# Altium footprint library BARKO_PCBLIB.PcbLib: 531 footprints (part 10 of 34)
Each footprint in its own frame and in the unit in brackets; x right, y up, seen from the top. Pads: shape width x height; smd on the part's side, far side on the other; paste and mask are expansions set on the pad; w line width, h text height; cw(c..) or ccw(c..) is an arc to the next point about the centre after c.
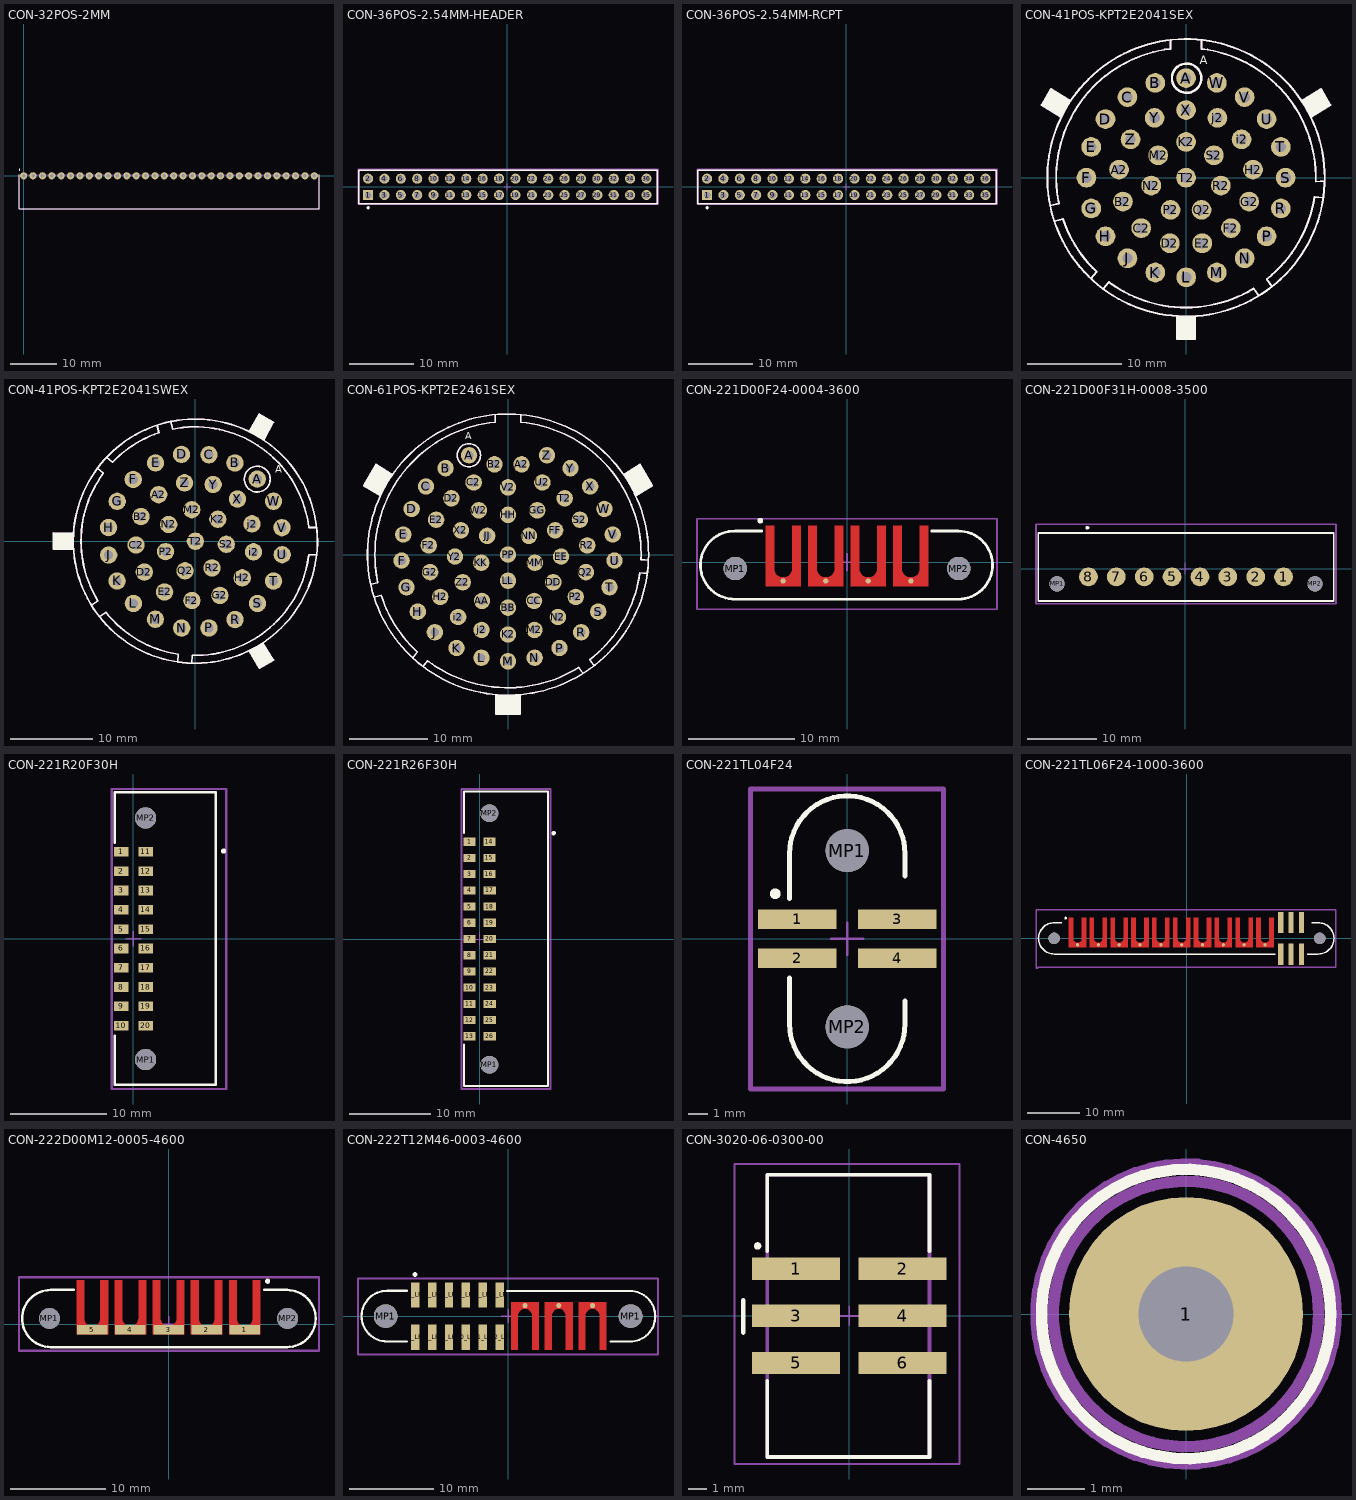
[diagram p9: the footprints below, top view; thin cyan lines are the x and y axes]

## CON-32POS-2MM [mil]
pads (32):
  round 60 hole 30: 1(0,0) 2(78.74,0) 3(157.48,0) 4(236.22,0) 5(314.96,0) 6(393.7,0) 7(472.44,0) 8(551.18,0) 9(629.92,0) 10(708.66,0) 11(787.4,0) 12(866.14,0) 13(944.88,0) 14(1023.62,0) 15(1102.36,0) 16(1181.1,0) 17(1259.84,0) 18(1338.58,0) 19(1417.32,0) 20(1496.06,0) 21(1574.8,0) 22(1653.54,0) 23(1732.28,0) 24(1811.02,0) 25(1889.76,0) 26(1968.5,0) 27(2047.24,0) 28(2125.98,0) 29(2204.72,0) 30(2283.46,0) 31(2362.2,0) 32(2440.94,0)
Top Overlay:
  circle w7.87: c-35.43,51.18 r3.94
  lines w10: -39.37,8.86 -39.37,-276.58 2480.32,-276.58 2480.32,8.86
ASM Top:
  lines w10: -39.37,-276.58 -39.37,8.86 2480.32,8.86 2480.32,-276.58 -39.37,-276.58
  text ".designator" at 1080.41,-156.5 h31.5
3D body "header_32pin_rightangle_2mm.stp": height 78.74, standoff -110.24, extent -39.37,-276.58 2480.32,8.86

## CON-36POS-2.54MM-HEADER [mm]
pads (36):
  rect 1.57x1.57 hole 1.02 paste-1000 mask+0: 1(-21.59,-1.27)
  round 1.57 hole 1.02 paste-1000 mask+0: 2(-21.59,1.27) 3(-19.05,-1.27) 4(-19.05,1.27) 5(-16.51,-1.27) 6(-16.51,1.27) 7(-13.97,-1.27) 8(-13.97,1.27) 9(-11.43,-1.27) 10(-11.43,1.27) 11(-8.89,-1.27) 12(-8.89,1.27) 13(-6.35,-1.27) 14(-6.35,1.27) 15(-3.81,-1.27) 16(-3.81,1.27) 17(-1.27,-1.27) 18(-1.27,1.27) 19(1.27,-1.27) 20(1.27,1.27) 21(3.81,-1.27) 22(3.81,1.27) 23(6.35,-1.27) 24(6.35,1.27) 25(8.89,-1.27) 26(8.89,1.27) 27(11.43,-1.27) 28(11.43,1.27) 29(13.97,-1.27) 30(13.97,1.27) 31(16.51,-1.27) 32(16.51,1.27) 33(19.05,-1.27) 34(19.05,1.27) 35(21.59,-1.27) 36(21.59,1.27)
Top Overlay:
  circle w0.25: c-21.575,-3.245 r0.125
  lines w0.2: -23.05,-2.605 23.27,-2.605 23.27,2.605 -23.05,2.605 -23.05,-2.605
Mechanical 15:
  lines w0.1: -0.5,0 0.5,0 ; 0,-0.5 0,0.5
  lines w0.2: -23.15,-2.705 23.37,-2.705 23.37,2.705 -23.15,2.705 -23.15,-2.705
ASM Top:
  lines w0.2: -23.05,-2.605 23.27,-2.605 23.27,2.605 -23.05,2.605 -23.05,-2.605
  text ".Designator" at -2.13,-0.3 h1
3D body "TSW-118-17-G-D.stp": height 18.3, standoff -2.78, extent -22.86,-2.54 22.86,2.54

## CON-36POS-2.54MM-RCPT [mm]
pads (36):
  rect 1.57x1.57 hole 1.02 paste-1000 mask+0: 1(-21.59,-1.27)
  round 1.57 hole 1.02 paste-1000 mask+0: 2(-21.59,1.27) 3(-19.05,-1.27) 4(-19.05,1.27) 5(-16.51,-1.27) 6(-16.51,1.27) 7(-13.97,-1.27) 8(-13.97,1.27) 9(-11.43,-1.27) 10(-11.43,1.27) 11(-8.89,-1.27) 12(-8.89,1.27) 13(-6.35,-1.27) 14(-6.35,1.27) 15(-3.81,-1.27) 16(-3.81,1.27) 17(-1.27,-1.27) 18(-1.27,1.27) 19(1.27,-1.27) 20(1.27,1.27) 21(3.81,-1.27) 22(3.81,1.27) 23(6.35,-1.27) 24(6.35,1.27) 25(8.89,-1.27) 26(8.89,1.27) 27(11.43,-1.27) 28(11.43,1.27) 29(13.97,-1.27) 30(13.97,1.27) 31(16.51,-1.27) 32(16.51,1.27) 33(19.05,-1.27) 34(19.05,1.27) 35(21.59,-1.27) 36(21.59,1.27)
Top Overlay:
  circle w0.25: c-21.575,-3.245 r0.125
  lines w0.2: -23.05,-2.605 -23.05,2.605 23.27,2.605 23.27,-2.605 -23.05,-2.605
Mechanical 15:
  lines w0.1: -0.5,0 0.5,0 ; 0,-0.5 0,0.5
  lines w0.2: -23.15,-2.705 -23.15,2.705 23.37,2.705 23.37,-2.705 -23.15,-2.705
ASM Top:
  lines w0.2: -23.05,-2.605 -23.05,2.605 23.27,2.605 23.27,-2.605 -23.05,-2.605
  text ".Designator" at -2.13,-0.3 h1
3D body "SSW-118-01-T-D.stp": height 8.52, standoff -2.63, extent -23.114,-2.476 23.114,2.477

## CON-41POS-KPT2E2041SEX [mm]
pads (41):
  round 2.1 hole 1.1: A(0,10.62) A2(-7.14,0.86) B(-3.28,10.11) B2(-6.73,-2.54) C(-6.25,8.59) C2(-4.78,-5.38) D(-8.59,6.25) D2(-1.73,-6.99) E(-10.11,3.28) E2(1.73,-6.99) F(-10.62,0) F2(4.78,-5.38) G(-10.11,-3.28) G2(6.73,-2.54) H(-8.59,-6.25) H2(7.14,0.86) i2(5.92,4.09) J(-6.25,-8.59) j2(3.35,6.38) K(-3.28,-10.11) K2(0,3.81) L(0.02,-10.62) M(3.28,-10.11) M2(-2.97,2.39) N(6.25,-8.59) N2(-3.71,-0.84) P(8.59,-6.25) P2(-1.65,-3.43) Q2(1.65,-3.43) R(10.11,-3.28) R2(3.71,-0.84) S(10.62,0) S2(2.97,2.39) T(10.11,3.28) T2(0,0) U(8.59,6.25) V(6.25,8.59) W(3.28,10.11) X(0,7.21) Y(-3.35,6.38) Z(-5.92,4.09)
Top Overlay:
  circle w0.254: c0.06,10.61 r1.561
  circle w0.2: c0,0 r14.79
  region: -14.405,9.457 -15.395,7.743 -13.316,6.436 -12.327,8.172
  region: -0.986,-14.757 -0.995,-17.2 0.985,-17.2 0.985,-14.757
  region: 14.396,9.457 12.327,8.172 13.3,6.469 15.386,7.743
  lines w0.2: -14.489,-2.996 -13.566,-2.749 ; -14.046,-4.648 -13.125,-4.401 ccw(c0,0) -9.524,-10.047 ; -13.565,-2.749 cw(c0,0) -1.653,13.741 ; -13.316,6.436 -15.395,7.743 -14.405,9.457 -12.327,8.172 ; -10.151,-10.761 -9.538,-10.032 ; -8.841,-11.861 -8.228,-11.131 ccw(c0,0) 7.226,-11.807 ; -1.659,13.741 -1.659,14.697 ; -0.986,-14.757 -0.995,-17.2 0.985,-17.2 0.985,-14.757 ; 1.651,14.697 1.651,13.741 cw(c0,0) 13.835,-0.352 ; 7.221,-11.806 7.763,-12.585 ; 8.609,-10.834 ccw(c0,0) 13.686,-2.047 ; 8.62,-10.825 9.164,-11.605 ; 12.327,8.172 14.396,9.457 15.386,7.743 13.3,6.469 ; 13.683,-2.056 14.629,-2.139 ; 13.833,-0.435 14.785,-0.352
  text "A" at 1.475,11.79 h1.52
ASM Top:
  circle w0.2: c0,0 r14.79
  circle w0.254: c0.06,10.61 r1.561
  region: 14.396,9.457 12.327,8.172 13.3,6.469 15.386,7.743
  region: -0.986,-14.757 -0.995,-17.2 0.985,-17.2 0.985,-14.757
  region: -14.405,9.457 -15.395,7.743 -13.316,6.436 -12.327,8.172
  lines w0.2: -14.489,-2.996 -13.566,-2.749 ; -14.046,-4.648 -13.125,-4.401 ccw(c0,0) -9.524,-10.047 ; -13.565,-2.749 cw(c0,0) -1.653,13.741 ; -13.316,6.436 -15.395,7.743 -14.405,9.457 -12.327,8.172 ; -10.151,-10.761 -9.538,-10.032 ; -8.841,-11.861 -8.228,-11.131 ccw(c0,0) 7.226,-11.807 ; -1.659,13.741 -1.659,14.697 ; -0.995,-17.2 -0.986,-14.757 ; 0.985,-17.2 0.985,-14.757 ; 1.651,14.697 1.651,13.741 cw(c0,0) 13.835,-0.352 ; 7.221,-11.806 7.763,-12.585 ; 8.609,-10.834 ccw(c0,0) 13.686,-2.047 ; 8.62,-10.825 9.164,-11.605 ; 12.327,8.172 14.396,9.457 15.386,7.743 13.3,6.469 ; 13.683,-2.056 14.629,-2.139 ; 13.833,-0.435 14.785,-0.352
  text ".designator" at -1.653,0 h0.8
  text "A" at 1.475,11.79 h1.52
3D body "KPT2E2041SEX.stp": height 26.32, standoff -5.18, extent -18.235,-18.23 18.236,18.23

## CON-41POS-KPT2E2041SWEX [mm]
pads (41):
  round 2.1 hole 1.1: A(7.5,7.51) A2(-4.44,5.63) B(4.79,9.47) B2(-6.59,2.97) C(1.64,10.46) C2(-7.18,-0.47) D(-1.67,10.51) D2(-6.18,-3.75) E(-4.82,9.48) E2(-3.72,-6.15) F(-7.52,7.48) F2(-0.42,-7.19) G(-9.46,4.82) G2(2.97,-6.57) H(-10.5,1.64) H2(5.68,-4.44) i2(7.05,-1.29) J(-10.49,-1.68) j2(6.87,2.1) K(-9.47,-4.82) K2(2.72,2.65) L(-7.5,-7.54) M(-4.84,-9.46) M2(-0.43,3.81) N(-1.65,-10.53) N2(-3.23,2.02) P(1.64,-10.51) P2(-3.6,-1.27) Q2(-1.24,-3.59) R(4.81,-9.5) R2(2.02,-3.24) S(7.53,-7.54) S2(3.75,-0.38) T(9.48,-4.84) T2(0,-0.01) U(10.52,-1.64) V(10.48,1.63) W(9.47,4.83) X(5.1,5.09) Y(2.16,6.86) Z(-1.3,7.06)
Top Overlay:
  circle w0.2: c7.5,7.51 r1.561
  region: 7.743,15.397 6.972,14.048 6.525,13.265 8.283,12.245 9.457,14.407
  pour cut-out: 9.601,-20.93
  region: 8.179,-12.335 6.516,-13.289 7.743,-15.384 9.457,-14.394
  region: -17.2,-0.984 -14.76,-0.984 -14.76,0.964 -17.2,0.996
  region: -21.184,-5.537
  lines w0.2: -14.76,-0.984 -17.2,-0.984 -17.2,0.996 -14.76,0.964 ; -11.862,8.844 cw(c0,-0.01) -10.761,10.153 -10.032,9.541 ; -11.861,8.843 -11.131,8.229 ccw(c0,0) -11.812,-7.219 ; -11.806,-7.215 -12.585,-7.761 ccw(c0,-0.01) -11.606,-9.163 ; -11.605,-9.162 -10.825,-8.616 ccw(c0,-0.01) -2.057,-13.685 ; -10.036,9.545 cw(c0,-0.01) -4.401,13.129 -4.648,14.048 cw(c0,-0.01) -2.996,14.49 -2.749,13.571 ; -2.748,13.565 cw(c0,0) 13.743,1.643 ; -2.056,-13.679 -2.139,-14.627 ccw(c0,-0.01) -0.435,-14.776 -0.352,-13.828 ccw(c0,-0.01) 13.726,-1.646 ; 8.277,12.25 ccw(c0,-0.01) 6.525,13.265 7.743,15.397 9.457,14.407 8.283,12.245 ; 13.741,-1.648 14.697,-1.648 ccw(c0,-0.01) 14.693,1.662 ; 13.741,1.662 14.697,1.662 ; 14.691,-1.647 cw(c0,0) 14.783,0 ; 6.516,-13.289 ccw(c0,-0.01) 8.179,-12.335 9.457,-14.394 7.743,-15.384 6.516,-13.289
  text "A" at 9.7,8 h1.52
ASM Top:
  circle w0.2: c7.5,7.51 r1.561
  region: -17.2,-0.984 -14.76,-0.984 -14.76,0.964 -17.2,0.996
  region: 8.179,-12.335 6.516,-13.289 7.743,-15.384 9.457,-14.394
  region: 7.743,15.397 6.972,14.048 6.525,13.265 8.283,12.245 9.457,14.407
  lines w0.2: -17.2,-0.984 -14.76,-0.984 ; -17.2,0.996 -14.76,0.964 ; -11.862,8.844 cw(c0,-0.01) -10.761,10.153 -10.032,9.541 ; -11.861,8.843 -11.131,8.229 ccw(c0,0) -11.812,-7.219 ; -11.806,-7.215 -12.585,-7.761 ccw(c0,-0.01) -11.606,-9.163 ; -11.605,-9.162 -10.825,-8.616 ccw(c0,-0.01) -2.057,-13.685 ; -10.036,9.545 cw(c0,-0.01) -4.401,13.129 -4.648,14.048 cw(c0,-0.01) -2.996,14.49 -2.749,13.571 ; -2.748,13.565 cw(c0,0) 13.743,1.643 ; -2.056,-13.679 -2.139,-14.627 ccw(c0,-0.01) -0.435,-14.776 -0.352,-13.828 ccw(c0,-0.01) 13.726,-1.646 ; 8.277,12.25 ccw(c0,-0.01) 6.525,13.265 7.743,15.397 9.457,14.407 8.283,12.245 ; 13.741,-1.648 14.697,-1.648 ccw(c0,-0.01) 14.693,1.662 ; 13.741,1.662 14.697,1.662 ; 14.691,-1.647 cw(c0,0) 14.783,0 ; 6.516,-13.289 ccw(c0,-0.01) 8.179,-12.335 9.457,-14.394 7.743,-15.384 6.516,-13.289
  text ".designator" at -1.118,-0.076 h0.8
  text "A" at 9.7,8 h1.52
3D body "KPT2E2041SWEX.stp": height 26.32, standoff -5.18, extent -18.23,-18.238 18.23,18.238

## CON-61POS-KPT2E2461SEX [mm]
pads (61):
  round 2.1 hole 1.1: A(-4.98,12.7) A2(1.73,11.53) AA(-3.33,-5.92) B(-7.98,11.05) B2(-1.73,11.53) BB(0,-6.78) C(-10.49,8.71) C2(-4.39,9.22) CC(3.33,-5.92) D(-12.32,5.84) D2(-7.24,7.19) DD(5.79,-3.53) E(-13.39,2.57) E2(-9.19,4.45) EE(6.78,-0.25) F(-13.61,-0.76) F2(-10.13,1.17) FF(6.02,3.1) G(-12.98,-4.17) G2(-9.96,-2.24) GG(3.73,5.66) H(-11.53,-7.29) H2(-8.66,-5.41) HH(0,5.08) i2(-6.38,-7.98) J(-9.35,-9.93) j2(-3.38,-9.63) JJ(-2.67,2.39) K(-6.58,-11.94) K2(0,-10.21) KK(-3.43,-1.04) L(-3.4,-13.18) LL(0,-3.35) M(0,-13.64) M2(3.38,-9.63) MM(3.43,-1.04) N(3.4,-13.18) N2(6.38,-7.98) NN(2.67,2.39) P(6.58,-11.94) P2(8.66,-5.41) PP(0,0) Q2(9.96,-2.24) R(9.35,-9.93) R2(10.13,1.17) S(11.53,-7.29) S2(9.19,4.45) T(12.98,-4.17) T2(7.24,7.19) U(13.61,-0.76) U2(4.39,9.22) V(13.39,2.57) V2(0,8.59) W(12.32,5.84) W2(-3.73,5.66) X(10.49,8.71) X2(-6.02,3.1) Y(7.98,11.05) Y2(-6.78,-0.25) Z(4.98,12.7) Z2(-5.79,-3.53)
Top Overlay:
  circle w0.2: c-5,12.7 r1.487
  circle w0.2: c0,0 r17.964
  region: 14.773,10.222 16.846,11.564 18.436,8.81 16.326,7.515
  region: -18.445,8.81 -16.318,7.509 -14.774,10.221 -16.855,11.564
  region: -1.594,-17.893 -1.594,-20.375 1.586,-20.375 1.586,-17.894
  lines w0.2: -16.641,-3.572 -17.56,-3.819 ccw(c0,0) -17.117,-5.47 -16.199,-5.224 ccw(c0,0) -11.585,-12.469 ; -16.635,-3.571 cw(c0,0) -1.66,16.933 ; -16.318,7.509 -18.445,8.81 -16.855,11.564 -14.774,10.221 ; -11.584,-12.468 -12.195,-13.197 ccw(c0,0) -10.885,-14.296 -10.274,-13.567 ccw(c0,0) 9.045,-14.416 ; -1.66,16.934 -1.66,17.648 -1.66,17.888 cw(c0,0) 1.65,17.888 1.65,16.934 ; -1.594,-17.893 -1.594,-20.375 1.586,-20.375 1.586,-17.894 ; 1.649,16.93 cw(c0,0) 16.998,-0.629 17.945,-0.712 cw(c0,0) 17.796,-2.416 16.849,-2.333 ; 9.041,-14.411 9.587,-15.19 ; 9.587,-15.189 ccw(c0,0) 10.988,-14.209 10.442,-13.43 ccw(c0,0) 16.851,-2.333 ; 14.773,10.222 16.846,11.564 18.436,8.81 16.326,7.515
  text "A" at -5.5,14.4 h1.5
ASM Top:
  circle w0.2: c0,0 r17.964
  circle w0.2: c-5,12.7 r1.487
  region: -1.594,-17.893 -1.594,-20.375 1.586,-20.375 1.586,-17.894
  region: -18.445,8.81 -16.318,7.509 -14.774,10.221 -16.855,11.564
  region: 14.773,10.222 16.846,11.564 18.436,8.81 16.326,7.515
  lines w0.2: -16.641,-3.572 -17.56,-3.819 ccw(c0,0) -17.117,-5.47 -16.199,-5.224 ccw(c0,0) -11.585,-12.469 ; -16.635,-3.571 cw(c0,0) -1.66,16.933 ; -16.318,7.509 -18.445,8.81 -16.855,11.564 -14.774,10.221 ; -11.584,-12.468 -12.195,-13.197 ccw(c0,0) -10.885,-14.296 -10.274,-13.567 ccw(c0,0) 9.045,-14.416 ; -1.66,16.934 -1.66,17.648 -1.66,17.888 cw(c0,0) 1.65,17.888 1.65,16.934 ; -1.594,-17.893 -1.594,-20.375 1.586,-20.375 1.586,-17.894 ; 1.649,16.93 cw(c0,0) 16.998,-0.629 17.945,-0.712 cw(c0,0) 17.796,-2.416 16.849,-2.333 ; 9.041,-14.411 9.587,-15.19 ; 9.587,-15.189 ccw(c0,0) 10.988,-14.209 10.442,-13.43 ccw(c0,0) 16.851,-2.333 ; 14.773,10.222 16.846,11.564 18.436,8.81 16.326,7.515
  text "A" at -5.5,14.4 h1.5
  text ".designator" at -1.346,-0.127 h0.8
3D body "KPT2E2461SEX.stp": height 26.35, standoff -5.18, extent -21.415,-21.41 21.416,21.41

## CON-221D00F24-0004-3600 [mm]
pads (6):
  round 0.5 smd mask+0.05: 1(-6,-1.762) 2(-2,-1.762) 3(2,-1.762) 4(6,-1.762)
  round 2.2 hole 2.2 unplated mask+0: MP1(-10.5,-0.587) MP2(10.5,-0.587)
Top Layer:
  region: 4.35,3.413 4.35,-2.238 7.65,-2.238 7.65,3.412 6.85,3.412 6.85,-0.587 6.843,-0.698 6.785,-0.913 6.674,-1.105 6.517,-1.262 6.325,-1.373 6.111,-1.43 5.889,-1.43 5.675,-1.373 5.483,-1.262 5.326,-1.105 5.215,-0.913 5.157,-0.698 5.15,-0.588 5.15,3.413
  region: 0.35,3.413 0.35,-2.238 3.65,-2.238 3.65,3.412 2.85,3.412 2.85,-0.587 2.843,-0.698 2.785,-0.913 2.674,-1.105 2.517,-1.262 2.325,-1.373 2.111,-1.43 1.889,-1.43 1.675,-1.373 1.483,-1.262 1.326,-1.105 1.215,-0.913 1.157,-0.698 1.15,-0.588 1.15,3.413
  region: -3.65,3.413 -3.65,-2.238 -0.35,-2.238 -0.35,3.412 -1.15,3.412 -1.15,-0.587 -1.157,-0.698 -1.215,-0.913 -1.326,-1.105 -1.483,-1.262 -1.675,-1.373 -1.889,-1.43 -2.111,-1.43 -2.325,-1.373 -2.517,-1.262 -2.674,-1.105 -2.785,-0.913 -2.843,-0.698 -2.85,-0.588 -2.85,3.413
  region: -7.65,3.413 -7.65,-2.238 -4.35,-2.238 -4.35,3.412 -5.15,3.412 -5.15,-0.587 -5.157,-0.698 -5.215,-0.913 -5.326,-1.105 -5.483,-1.262 -5.675,-1.373 -5.889,-1.43 -6.111,-1.43 -6.325,-1.373 -6.517,-1.262 -6.674,-1.105 -6.785,-0.913 -6.843,-0.698 -6.85,-0.588 -6.85,3.413
Top Overlay:
  circle w0.3: c-8.15,3.912 r0.12
  lines w0.254: -8,2.937 -10.5,2.937 ccw(c-10.575,-0.263) -10.5,-3.463 10.475,-3.462 ccw(c10.475,-0.263) 10.475,2.937 7.975,2.937
Top Paste:
  region: 4.35,3.413 5.15,3.413 5.15,-0.573 5.154,-0.657 5.187,-0.822 5.251,-0.977 5.345,-1.117 5.463,-1.236 5.603,-1.329 5.758,-1.393 5.923,-1.426 6.007,-1.43 6.09,-1.426 6.252,-1.394 6.405,-1.331 6.542,-1.239 6.659,-1.122 6.751,-0.985 6.814,-0.832 6.846,-0.67 6.85,-0.587 6.85,3.412 7.65,3.412 7.65,-2.238 4.35,-2.238
  region: 0.35,3.413 1.15,3.413 1.15,-0.573 1.154,-0.657 1.187,-0.822 1.251,-0.977 1.345,-1.117 1.463,-1.236 1.603,-1.329 1.758,-1.393 1.923,-1.426 2.007,-1.43 2.09,-1.426 2.252,-1.394 2.405,-1.331 2.542,-1.239 2.659,-1.122 2.751,-0.985 2.814,-0.832 2.846,-0.67 2.85,-0.587 2.85,3.412 3.65,3.412 3.65,-2.238 0.35,-2.238
  region: -3.65,3.413 -2.85,3.413 -2.85,-0.573 -2.846,-0.657 -2.813,-0.822 -2.749,-0.977 -2.655,-1.117 -2.537,-1.236 -2.397,-1.329 -2.242,-1.393 -2.077,-1.426 -1.993,-1.43 -1.91,-1.426 -1.748,-1.394 -1.595,-1.331 -1.458,-1.239 -1.341,-1.122 -1.249,-0.985 -1.186,-0.832 -1.154,-0.67 -1.15,-0.587 -1.15,3.412 -0.35,3.412 -0.35,-2.238 -3.65,-2.238
  region: -7.65,3.413 -6.85,3.413 -6.85,-0.573 -6.846,-0.657 -6.813,-0.822 -6.749,-0.977 -6.655,-1.117 -6.537,-1.236 -6.397,-1.329 -6.242,-1.393 -6.077,-1.426 -5.993,-1.43 -5.91,-1.426 -5.748,-1.394 -5.595,-1.331 -5.458,-1.239 -5.341,-1.122 -5.249,-0.985 -5.186,-0.832 -5.154,-0.67 -5.15,-0.587 -5.15,3.412 -4.35,3.412 -4.35,-2.238 -7.65,-2.238
Top Solder:
  region: 4.325,3.425 4.325,-2.275 7.675,-2.275 7.675,3.425 6.825,3.425 6.825,-0.783 6.779,-0.916 6.626,-1.15 6.405,-1.323 6.14,-1.414 5.86,-1.414 5.595,-1.323 5.374,-1.15 5.221,-0.916 5.175,-0.783 5.175,3.425
  region: 0.325,3.425 0.325,-2.275 3.675,-2.275 3.675,3.425 2.825,3.425 2.825,-0.783 2.779,-0.916 2.626,-1.15 2.405,-1.323 2.14,-1.414 1.86,-1.414 1.595,-1.323 1.374,-1.15 1.221,-0.916 1.175,-0.783 1.175,3.425
  region: -3.675,3.425 -3.675,-2.275 -0.325,-2.275 -0.325,3.425 -1.175,3.425 -1.175,-0.783 -1.221,-0.916 -1.374,-1.15 -1.595,-1.323 -1.86,-1.414 -2.14,-1.414 -2.405,-1.323 -2.626,-1.15 -2.779,-0.916 -2.825,-0.783 -2.825,3.425
  region: -7.675,3.425 -7.675,-2.275 -4.325,-2.275 -4.325,3.425 -5.175,3.425 -5.175,-0.783 -5.221,-0.916 -5.374,-1.15 -5.595,-1.323 -5.86,-1.414 -6.14,-1.414 -6.405,-1.323 -6.626,-1.15 -6.779,-0.916 -6.825,-0.783 -6.825,3.425
Mechanical 15:
  lines w0.15: -0.8,0 0,0 ; 0,-0.8 0,0 ; 0,0.8 0,0 ; 0.8,0 0,0 ; -14.1,-4.413 -14.1,4.088 14.1,4.088 14.1,3.487 14.1,-4.413 -14.1,-4.413
3D body "221D00F24-0004-3600.STEP": height 5.86, standoff -6.24, extent -13,-3.337 13,2.767
3D body: height 0.25, standoff 0, extent -1.905,6.302 -1.905,6.302

## CON-221D00F31H-0008-3500 [mm]
pads (10):
  round 2.7 smd: 1(14.1,-1.2) 2(10.1,-1.2) 3(6.1,-1.2) 4(2.1,-1.2) 5(-1.9,-1.2) 6(-5.9,-1.2) 7(-9.9,-1.2) 8(-13.9,-1.2)
  round 2.2 hole 2.2 unplated: MP1(-18.4,-2.2) MP2(18.6,-2.2)
Top Overlay:
  circle w0.3: c-14.05,5.85 r0.12
  lines w0.254: -21.1,-4.675 21.3,-4.675 21.3,5.1 -21.1,5.1 -21.1,-4.675
Mechanical 15:
  lines w0.15: -0.8,0 0,0 ; 0,-0.8 0,0 ; 0,0.8 0,0 ; 0.8,0 0,0
  lines w0.254: -21.425,-5.05 21.625,-5.05 21.625,6.35 -21.425,6.35 -21.425,-5.05
3D body "221D00F31H-0008-3500.STEP": height 5.33, standoff -7.5, extent -20.9,-4.5 21.1,4.85

## CON-221R20F30H [mm]
pads (22):
  rect 1.5x1 smd mask+0.05: 1(-1.25,9) 2(-1.25,7) 3(-1.25,5) 4(-1.25,3) 5(-1.25,1) 6(-1.25,-1) 7(-1.25,-3) 8(-1.25,-5) 9(-1.25,-7) 10(-1.25,-9) 11(1.25,9) 12(1.25,7) 13(1.25,5) 14(1.25,3) 15(1.25,1) 16(1.25,-1) 17(1.25,-3) 18(1.25,-5) 19(1.25,-7) 20(1.25,-9)
  round 2.2 hole 2.2 unplated: MP1(1.25,-12.5) MP2(1.25,12.5)
Top Overlay:
  circle w0.3: c9.325,9.075 r0.12
  lines w0.254: -1.95,-10.025 -1.95,-15.125 8.525,-15.125 8.525,15.15 -1.95,15.15 -1.95,9.95
Mechanical 15:
  lines w0.15: -0.8,0 0,0 ; 0,-0.8 0,0 ; 0,0.8 0,0 ; 0.8,0 0,0
  lines w0.254: -2.25,-15.55 9.6,-15.55 9.6,15.5 -2.25,15.5 -2.25,-15.55
3D body "221R20F30H.STEP": height 5.89, standoff -4.93, extent -1.718,-15 8.35,15

## CON-221R26F30H [mm]
pads (28):
  rect 1.5x1 smd mask+0.05: 1(-1.25,12) 2(-1.25,10) 3(-1.25,8) 4(-1.25,6) 5(-1.25,4) 6(-1.25,2) 7(-1.25,0) 8(-1.25,-2) 9(-1.25,-4) 10(-1.25,-6) 11(-1.25,-8) 12(-1.25,-10) 13(-1.25,-12) 14(1.2,12) 15(1.2,10) 16(1.2,8) 17(1.25,6) 18(1.25,4) 19(1.25,2) 20(1.25,0) 21(1.25,-2) 22(1.25,-4) 23(1.25,-6) 24(1.25,-8) 25(1.25,-10) 26(1.25,-12)
  round 2.2 hole 2.2 unplated: MP1(1.2,-15.5) MP2(1.2,15.5)
Top Overlay:
  circle w0.3: c9.125,13.05 r0.12
  lines w0.254: -1.95,-13.025 -1.95,-18.15 8.45,-18.15 8.45,18.175 -1.925,18.175 -1.925,13.05
Mechanical 15:
  lines w0.15: -0.8,0 0,0 ; 0,-0.8 0,0 ; 0,0.8 0,0 ; 0.8,0 0,0
  lines w0.254: -2.25,-18.5 -2.25,18.5 8.725,18.5 8.725,-18.5 -2.25,-18.5
3D body "221R26F30H.STEP": height 5.87, standoff -4.96, extent -1.768,-18 8.3,18

## CON-221TL04F24 [mm]
pads (6):
  rect 4x1 smd mask+0.05: 1(-2.55,1) 2(-2.55,-1) 3(2.55,1) 4(2.55,-1)
  round 2.2 hole 2.2 unplated: MP1(0,4.5) MP2(0,-4.5)
Top Overlay:
  circle w0.3: c-3.675,2.3 r0.12
  lines w0.254: -2.95,-2 -2.95,-4.35 ccw(c0,-4.35) 2.95,-4.35 2.95,-3.175 ; -2.95,2.05 -2.95,4.35 cw(c0,4.35) 2.95,4.35 2.95,3.2
Mechanical 15:
  lines w0.15: -0.8,0 0,0 ; 0,-0.8 0,0 ; 0,0.8 0,0 ; 0.8,0 0,0
  lines w0.254: -4.95,-7.675 -4.95,7.65 4.925,7.65 4.925,-7.675 -4.95,-7.675
3D body "221TL04F24.STEP": height 5.9, standoff -7, extent -4.389,-7 4.389,7

## CON-221TL06F24-1000-3600 [mm]
pads (18):
  round 0.6 smd mask+0.05: 1_HP(-21,-1.225) 2_HP(-17,-1.225) 3_HP(-13,-1.225) 4_HP(-9,-1.225) 5_HP(-5,-1.225) 6_HP(-1,-1.225) 7_HP(3,-1.225) 8_HP(7,-1.225) 9_HP(11,-1.225) 10_HP(15,-1.225)
  rect 1x4.1 smd mask+0.05: 1_LF(18,-3.05) 2_LF(20,-3.05) 3_LF(22,-3.05) 4_LF(18,3.05) 5_LF(20,3.05) 6_LF(22,3.05)
  round 2.2 hole 2.2 unplated: MP1(25.5,0) MP2(-25.5,0)
Top Layer:
  region: 13.35,4 13.35,-1.65 16.65,-1.65 16.65,4 15.85,4 15.85,0 15.843,-0.111 15.785,-0.325 15.674,-0.517 15.517,-0.674 15.325,-0.785 15.111,-0.843 14.889,-0.843 14.675,-0.785 14.483,-0.674 14.326,-0.517 14.215,-0.325 14.157,-0.111 14.15,0 14.15,4
  region: 9.35,4 9.35,-1.65 12.65,-1.65 12.65,4 11.85,4 11.85,0 11.843,-0.111 11.785,-0.325 11.674,-0.517 11.517,-0.674 11.325,-0.785 11.111,-0.843 10.889,-0.843 10.675,-0.785 10.483,-0.674 10.326,-0.517 10.215,-0.325 10.157,-0.111 10.15,0 10.15,4
  region: 5.35,4 5.35,-1.65 8.65,-1.65 8.65,4 7.85,4 7.85,0 7.843,-0.111 7.785,-0.325 7.674,-0.517 7.517,-0.674 7.325,-0.785 7.111,-0.843 6.889,-0.843 6.675,-0.785 6.483,-0.674 6.326,-0.517 6.215,-0.325 6.157,-0.111 6.15,0 6.15,4
  region: 1.35,4 1.35,-1.65 4.65,-1.65 4.65,4 3.85,4 3.85,0 3.843,-0.111 3.785,-0.325 3.674,-0.517 3.517,-0.674 3.325,-0.785 3.111,-0.843 2.889,-0.843 2.675,-0.785 2.483,-0.674 2.326,-0.517 2.215,-0.325 2.157,-0.111 2.15,0 2.15,4
  region: -2.65,4 -2.65,-1.65 0.65,-1.65 0.65,4 -0.15,4 -0.15,0 -0.157,-0.111 -0.215,-0.325 -0.326,-0.517 -0.483,-0.674 -0.675,-0.785 -0.889,-0.843 -1.111,-0.843 -1.325,-0.785 -1.517,-0.674 -1.674,-0.517 -1.785,-0.325 -1.843,-0.111 -1.85,0 -1.85,4
  region: -6.65,4 -6.65,-1.65 -3.35,-1.65 -3.35,4 -4.15,4 -4.15,0 -4.157,-0.111 -4.215,-0.325 -4.326,-0.517 -4.483,-0.674 -4.675,-0.785 -4.889,-0.843 -5.111,-0.843 -5.325,-0.785 -5.517,-0.674 -5.674,-0.517 -5.785,-0.325 -5.843,-0.111 -5.85,0 -5.85,4
  region: -10.65,4 -10.65,-1.65 -7.35,-1.65 -7.35,4 -8.15,4 -8.15,0 -8.157,-0.111 -8.215,-0.325 -8.326,-0.517 -8.483,-0.674 -8.675,-0.785 -8.889,-0.843 -9.111,-0.843 -9.325,-0.785 -9.517,-0.674 -9.674,-0.517 -9.785,-0.325 -9.843,-0.111 -9.85,0 -9.85,4
  region: -14.65,4 -14.65,-1.65 -11.35,-1.65 -11.35,4 -12.15,4 -12.15,0 -12.157,-0.111 -12.215,-0.325 -12.326,-0.517 -12.483,-0.674 -12.675,-0.785 -12.889,-0.843 -13.111,-0.843 -13.325,-0.785 -13.517,-0.674 -13.674,-0.517 -13.785,-0.325 -13.843,-0.111 -13.85,0 -13.85,4
  region: -18.65,4 -18.65,-1.65 -15.35,-1.65 -15.35,4 -16.15,4 -16.15,0 -16.157,-0.111 -16.215,-0.325 -16.326,-0.517 -16.483,-0.674 -16.675,-0.785 -16.889,-0.843 -17.111,-0.843 -17.325,-0.785 -17.517,-0.674 -17.674,-0.517 -17.785,-0.325 -17.843,-0.111 -17.85,0 -17.85,4
  region: -22.65,4 -22.65,-1.65 -19.35,-1.65 -19.35,4 -20.15,4 -20.15,0 -20.157,-0.111 -20.215,-0.325 -20.326,-0.517 -20.483,-0.674 -20.675,-0.785 -20.889,-0.843 -21.111,-0.843 -21.325,-0.785 -21.517,-0.674 -21.674,-0.517 -21.785,-0.325 -21.843,-0.111 -21.85,0 -21.85,4
Top Overlay:
  circle w0.3: c-23.275,3.9 r0.12
  lines w0.254: -24.025,3 -25.5,3 ccw(c-25.5,0) -25.5,-3 17,-3 ; 23.15,-3 25.25,-3 ccw(c25.25,0) 25.25,3 23.95,3
Top Paste:
  drawing of 10 lines, arcs and shapes, not listed
Top Solder:
  drawing of 10 lines, arcs and shapes, not listed
Mechanical 15:
  lines w0.15: -0.8,0 0,0 ; 0,-0.8 0,0 ; 0,0.8 0,0 ; 0.8,0 0,0
  lines w0.254: -28.975,-5.7 -28.725,-5.7 -28.575,-5.55 28.625,-5.55 28.625,-5.25 28.625,5.475 -28.975,5.475 -28.975,-5.7
3D body "221TL06F24-1000-3600.STEP": height 5.85, standoff -7.05, extent -28.075,-4.353 27.925,4.425

## CON-222D00M12-0005-4600 [mm]
pads (7):
  rect 3.2x1 smd: 1(8,-0.592) 2(4,-0.592) 3(0,-0.592) 4(-4,-0.592) 5(-8,-0.592)
  round 2.2 hole 2.2: MP1(-12.5,0.593) MP2(12.5,0.593)
Top Layer:
  region: -9.65,4.593 -9.65,-1.057 -6.35,-1.057 -6.35,4.592 -7.15,4.593 -7.15,0.593 -7.157,0.482 -7.215,0.267 -7.326,0.075 -7.483,-0.082 -7.675,-0.193 -7.889,-0.25 -8.111,-0.25 -8.325,-0.193 -8.517,-0.082 -8.674,0.075 -8.785,0.267 -8.843,0.482 -8.85,0.592 -8.85,4.593
  region: -5.65,4.593 -5.65,-1.057 -2.35,-1.057 -2.35,4.592 -3.15,4.593 -3.15,0.593 -3.157,0.482 -3.215,0.267 -3.326,0.075 -3.483,-0.082 -3.675,-0.193 -3.889,-0.25 -4.111,-0.25 -4.325,-0.193 -4.517,-0.082 -4.674,0.075 -4.785,0.267 -4.843,0.482 -4.85,0.592 -4.85,4.593
  region: -1.65,4.593 -1.65,-1.057 1.65,-1.057 1.65,4.592 0.85,4.593 0.85,0.593 0.843,0.482 0.785,0.267 0.674,0.075 0.517,-0.082 0.325,-0.193 0.111,-0.25 -0.111,-0.25 -0.325,-0.193 -0.517,-0.082 -0.674,0.075 -0.785,0.267 -0.843,0.482 -0.85,0.592 -0.85,4.593
  region: 2.35,4.593 2.35,-1.057 5.65,-1.057 5.65,4.592 4.85,4.593 4.85,0.593 4.843,0.482 4.785,0.267 4.674,0.075 4.517,-0.082 4.325,-0.193 4.111,-0.25 3.889,-0.25 3.675,-0.193 3.483,-0.082 3.326,0.075 3.215,0.267 3.157,0.482 3.15,0.592 3.15,4.593
  region: 6.35,4.593 6.35,-1.057 9.65,-1.057 9.65,4.592 8.85,4.593 8.85,0.593 8.843,0.482 8.785,0.267 8.674,0.075 8.517,-0.082 8.325,-0.193 8.111,-0.25 7.889,-0.25 7.675,-0.193 7.483,-0.082 7.326,0.075 7.215,0.267 7.157,0.482 7.15,0.592 7.15,4.593
Top Overlay:
  circle w0.3: c10.4,4.5 r0.12
  lines w0.254: -9.95,3.582 -12.375,3.582 ccw(c-12.375,0.583) -12.375,-2.417 12.45,-2.417 ccw(c12.45,0.583) 12.45,3.582 10.025,3.582
Top Paste:
  region: -9.65,4.593 -8.85,4.593 -8.85,0.6 -8.846,0.516 -8.813,0.353 -8.75,0.199 -8.657,0.061 -8.539,-0.057 -8.401,-0.15 -8.247,-0.214 -8.083,-0.246 -8,-0.25 -7.993,-0.25 -7.91,-0.246 -7.748,-0.214 -7.595,-0.151 -7.458,-0.059 -7.341,0.058 -7.249,0.195 -7.186,0.348 -7.154,0.51 -7.15,0.593 -7.15,4.593 -6.35,4.593 -6.35,-1.057 -9.65,-1.057
  region: -5.65,4.593 -4.85,4.593 -4.85,0.6 -4.846,0.516 -4.813,0.353 -4.75,0.199 -4.657,0.061 -4.539,-0.057 -4.401,-0.15 -4.247,-0.214 -4.083,-0.246 -4,-0.25 -3.993,-0.25 -3.91,-0.246 -3.748,-0.214 -3.595,-0.151 -3.458,-0.059 -3.341,0.058 -3.249,0.195 -3.186,0.348 -3.154,0.51 -3.15,0.593 -3.15,4.593 -2.35,4.593 -2.35,-1.057 -5.65,-1.057
  region: -1.65,4.593 -0.85,4.593 -0.85,0.6 -0.846,0.516 -0.813,0.353 -0.75,0.199 -0.657,0.061 -0.539,-0.057 -0.401,-0.15 -0.247,-0.214 -0.083,-0.246 0,-0.25 0.007,-0.25 0.09,-0.246 0.252,-0.214 0.405,-0.151 0.542,-0.059 0.659,0.058 0.751,0.195 0.814,0.348 0.846,0.51 0.85,0.593 0.85,4.593 1.65,4.593 1.65,-1.057 -1.65,-1.057
  region: 2.35,4.593 3.15,4.593 3.15,0.6 3.154,0.516 3.187,0.353 3.25,0.199 3.343,0.061 3.461,-0.057 3.599,-0.15 3.753,-0.214 3.917,-0.246 4,-0.25 4.007,-0.25 4.09,-0.246 4.252,-0.214 4.405,-0.151 4.542,-0.059 4.659,0.058 4.751,0.195 4.814,0.348 4.846,0.51 4.85,0.593 4.85,4.593 5.65,4.593 5.65,-1.057 2.35,-1.057
  region: 6.35,4.593 7.15,4.593 7.15,0.6 7.154,0.516 7.187,0.353 7.25,0.199 7.343,0.061 7.461,-0.057 7.599,-0.15 7.753,-0.214 7.917,-0.246 8,-0.25 8.007,-0.25 8.09,-0.246 8.252,-0.214 8.405,-0.151 8.542,-0.059 8.659,0.058 8.751,0.195 8.814,0.348 8.846,0.51 8.85,0.593 8.85,4.593 9.65,4.593 9.65,-1.057 6.35,-1.057
Top Solder:
  region: -9.65,4.593 -9.65,-1.057 -6.35,-1.057 -6.35,4.592 -7.15,4.593 -7.15,0.593 -7.157,0.482 -7.215,0.267 -7.326,0.075 -7.483,-0.082 -7.675,-0.193 -7.889,-0.25 -8.111,-0.25 -8.325,-0.193 -8.517,-0.082 -8.674,0.075 -8.785,0.267 -8.843,0.482 -8.85,0.592 -8.85,4.593
  region: -5.65,4.593 -5.65,-1.057 -2.35,-1.057 -2.35,4.592 -3.15,4.593 -3.15,0.593 -3.157,0.482 -3.215,0.267 -3.326,0.075 -3.483,-0.082 -3.675,-0.193 -3.889,-0.25 -4.111,-0.25 -4.325,-0.193 -4.517,-0.082 -4.674,0.075 -4.785,0.267 -4.843,0.482 -4.85,0.592 -4.85,4.593
  region: -1.65,4.593 -1.65,-1.057 1.65,-1.057 1.65,4.592 0.85,4.593 0.85,0.593 0.843,0.482 0.785,0.267 0.674,0.075 0.517,-0.082 0.325,-0.193 0.111,-0.25 -0.111,-0.25 -0.325,-0.193 -0.517,-0.082 -0.674,0.075 -0.785,0.267 -0.843,0.482 -0.85,0.592 -0.85,4.593
  region: 2.35,4.593 2.35,-1.057 5.65,-1.057 5.65,4.592 4.85,4.593 4.85,0.593 4.843,0.482 4.785,0.267 4.674,0.075 4.517,-0.082 4.325,-0.193 4.111,-0.25 3.889,-0.25 3.675,-0.193 3.483,-0.082 3.326,0.075 3.215,0.267 3.157,0.482 3.15,0.592 3.15,4.593
  region: 6.35,4.593 6.35,-1.057 9.65,-1.057 9.65,4.592 8.85,4.593 8.85,0.593 8.843,0.482 8.785,0.267 8.674,0.075 8.517,-0.082 8.325,-0.193 8.111,-0.25 7.889,-0.25 7.675,-0.193 7.483,-0.082 7.326,0.075 7.215,0.267 7.157,0.482 7.15,0.592 7.15,4.593
Mechanical 15:
  lines w0.15: -0.8,0 0,0 ; 0,-0.8 0,0 ; 0,0.8 0,0 ; 0.8,0 0,0
  lines w0.254: -15.7,-2.817 -15.7,4.933 15.8,4.933 15.8,-2.817 -15.7,-2.817
3D body "222D00M12-0005-4600.STEP": height 6.86, standoff -4.49, extent -15,-2.157 15,3.947

## CON-222T12M46-0003-4600 [mm]
pads (17):
  round 0.6 smd mask+0.05: 1_HP(2,1.25) 2_HP(6,1.25) 3_HP(10,1.25)
  rect 1x3 smd mask+0.05: 1_LF(-11,2.5) 2_LF(-9,2.5) 3_LF(-7,2.5) 4_LF(-5,2.5) 5_LF(-3,2.5) 6_LF(-1,2.5) 7_LF(-11,-2.5) 8_LF(-9,-2.5) 9_LF(-7,-2.5) 10_LF(-5,-2.5) 11_LF(-3,-2.5) 12_LF(-1,-2.5)
  round 2.8 hole 2.8 unplated: MP1(-14.5,0) MP1(14.5,0)
Top Layer:
  region: 3.65,-4 3.65,1.65 0.35,1.65 0.35,-4 1.15,-4 1.15,0 1.157,0.111 1.215,0.325 1.326,0.517 1.483,0.674 1.675,0.785 1.889,0.843 2.111,0.843 2.325,0.785 2.517,0.674 2.674,0.517 2.785,0.325 2.843,0.111 2.85,0 2.85,-4
  region: 7.65,-4 7.65,1.65 4.35,1.65 4.35,-4 5.15,-4 5.15,0 5.157,0.111 5.215,0.325 5.326,0.517 5.483,0.674 5.675,0.785 5.889,0.843 6.111,0.843 6.325,0.785 6.517,0.674 6.674,0.517 6.785,0.325 6.843,0.111 6.85,0 6.85,-4
  region: 11.65,-4 11.65,1.65 8.35,1.65 8.35,-4 9.15,-4 9.15,0 9.157,0.111 9.215,0.325 9.326,0.517 9.483,0.674 9.675,0.785 9.889,0.843 10.111,0.843 10.325,0.785 10.517,0.674 10.674,0.517 10.785,0.325 10.843,0.111 10.85,0 10.85,-4
Top Overlay:
  circle w0.3: c-11.025,4.925 r0.12
  lines w0.254: -12,-3 -14.35,-3 cw(c-14.35,0) -14.35,3 -12,3 ; -0.125,2.975 14.425,2.975 cw(c14.425,-0.025) 14.425,-3.025 12.15,-3.025
Top Solder:
  region: 11.65,-4 11.65,1.65 8.35,1.65 8.35,-4 9.15,-4 9.15,0 9.157,0.111 9.215,0.325 9.326,0.517 9.483,0.674 9.675,0.785 9.889,0.843 10.111,0.843 10.325,0.785 10.517,0.674 10.674,0.517 10.785,0.325 10.843,0.111 10.85,0 10.85,-4
  region: 7.65,-4 7.65,1.65 4.35,1.65 4.35,-4 5.15,-4 5.15,0 5.157,0.111 5.215,0.325 5.326,0.517 5.483,0.674 5.675,0.785 5.889,0.843 6.111,0.843 6.325,0.785 6.517,0.674 6.674,0.517 6.785,0.325 6.843,0.111 6.85,0 6.85,-4
  region: 3.65,-4 3.65,1.65 0.35,1.65 0.35,-4 1.15,-4 1.15,0 1.157,0.111 1.215,0.325 1.326,0.517 1.483,0.674 1.675,0.785 1.889,0.843 2.111,0.843 2.325,0.785 2.517,0.674 2.674,0.517 2.785,0.325 2.843,0.111 2.85,0 2.85,-4
Mechanical 15:
  lines w0.15: -0.8,0 0,0 ; 0,-0.8 0,0 ; 0,0.8 0,0 ; 0.8,0 0,0
  lines w0.254: -17.775,-4.55 -17.775,4.45 -17.55,4.45 17.75,4.45 17.75,-4.55 -17.775,-4.55
3D body "222T12M46-0003-4600.STEP": height 5.3, standoff -5.6, extent -17,-3.354 17,3.25

## CON-3020-06-0300-00 [mm]
pads (6):
  rect 4.75x1.2 smd: 1(-2.875,2.54) 2(2.875,2.54) 3(-2.875,0) 4(2.875,0) 5(-2.875,-2.54) 6(2.875,-2.54)
Top Overlay:
  circle w0.2: c-4.95,3.775 r0.1
  lines w0.2: -4.425,-3.5 -4.425,-7.62 4.325,-7.62 4.325,-3.5 ; -4.425,3.5 -4.425,7.62 4.325,7.62 4.325,3.5
  lines w0.254: -5.725,-0.9 -5.725,0.85
Mechanical 15:
  lines w0.1: -0.5,0 0.5,0 ; 0,-0.5 0,0.5 ; -6.2,-8 5.95,-8 5.95,8.2 -6.2,8.2 -6.2,-8
ASM Top:
  lines w0.2: -4.425,-7.625 4.325,-7.625 4.325,7.625 -4.425,7.625 -4.425,-7.625
  text ".designator" at 0,0 h1.2
3D body "HTST-103-01-T-DV-P-TR.stp": height 11.44, standoff 0.01, extent -5.588,-7.62 5.588,7.62

## CON-4650 [mil]
height 1800
pads (1):
  round 160 hole 65: 1(0,0)
Top Overlay:
  circle w7.87: c0,0 r98.66
Bottom Overlay:
  circle w7.87: c0,0 r98.66
Mechanical 15:
  circle w7.87: c0,0 r102.36
  lines w3.94: -39.37,0 39.37,0 ; 0,-39.37 0,39.37
ASM Top:
  circle w7.87: c0,0 r90.64
  text ".designator" at -31.5,-11.81 h59.06
3D body "mill-max-4650-0-00-15-00-00-03-0 (1).step": height 925.5, standoff -874.54, extent -62.49,-62.49 63.13,62.51